# Altium footprint library Vowstar_Basic_Device.PcbLib: 170 footprints (part 1 of 11)
Each footprint in its own frame and in the unit in brackets; x right, y up, seen from the top. Pads: shape width x height; smd on the part's side, far side on the other; paste and mask are expansions set on the pad; w line width, h text height; cw(c..) or ccw(c..) is an arc to the next point about the centre after c.
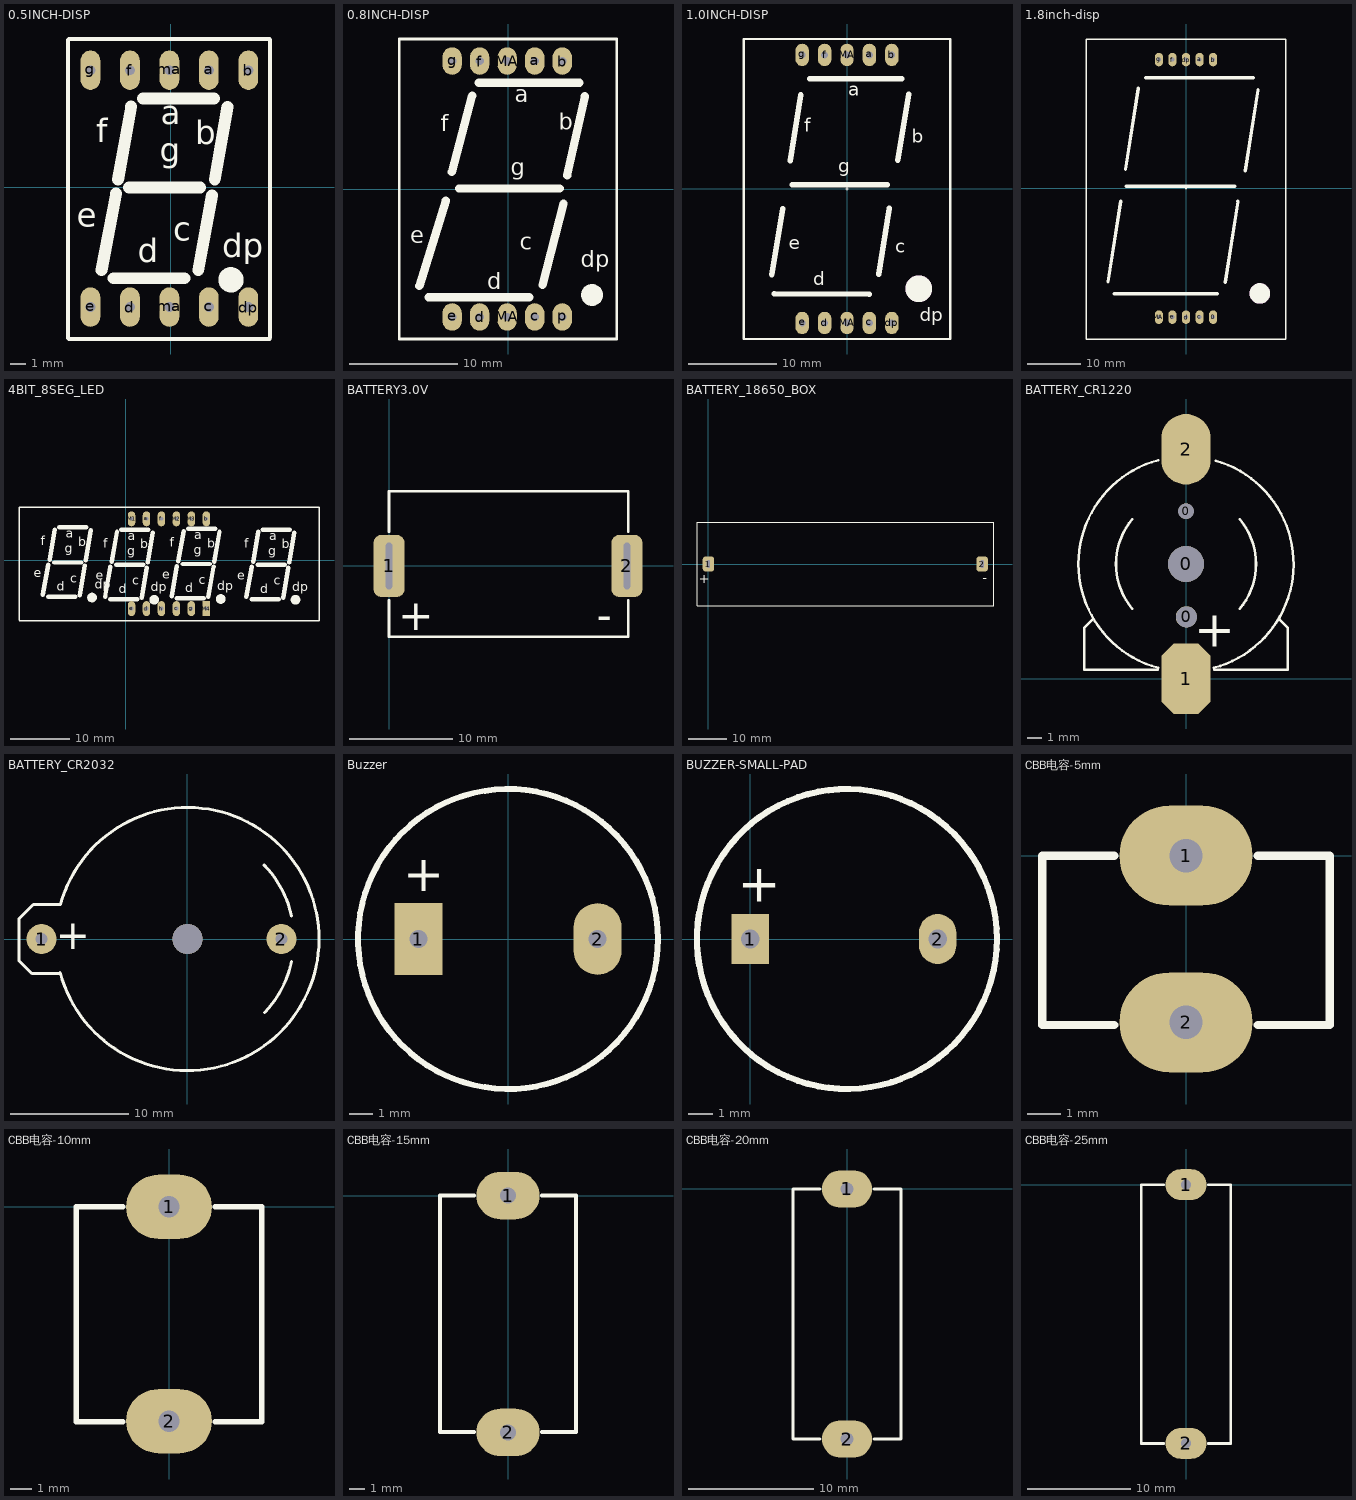
[diagram p0: the footprints below, top view; thin cyan lines are the x and y axes]

## 0.5INCH-DISP [mil]
pads (10):
  oval 50x100 hole 25: a(97,297) b(197,297) c(97,-303) d(-103,-303) dp(197,-303) e(-203,-303) f(-103,297) g(-203,297) ma(-3,-303) ma(-3,297)
Top Overlay:
  circle w40: c153,-234 r12
  lines w10: -260,-382 -260,374 ; -258,-384 251,-384 ; -258,376 251,376 ; 252,-380 252,374
  lines w30: -175,-210 -138,-15 ; -145,-230 35,-230 ; -133,20 -100,205 ; -105,0 75,0 ; -70,225 110,225 ; 70,-210 105,-20 ; 112,20 144.25,204.26
  text "c" at 7,-135 h60
  text "dp" at 131,-177 h60
  text "e" at -238,-100 h60
  text "d" at -83,-190 h60
  text "a" at -25,160 h60
  text "g" at -28,65 h60
  text "b" at 62,110 h60
  text "f" at -188,115 h60

## 0.8INCH-DISP [mil]
pads (10):
  oval 70x100 hole 30: a(97,465) b(197,465) c(97,-465) d(-103,-465) e(-203,-465) f(-103,465) g(-203,465) MA(-3,-465) MA(-3,465) p(197,-465)
Top Overlay:
  circle w40: c305.31,-385 r19.68
  lines w10: -395,-545 -395,545 395,545 395,-545 -395,-545
  lines w30: -322,-352 -226,-42 ; -289,-393 77.14,-393 ; -204,62 -130,339 ; -177.68,2.24 188.47,2.24 ; -108,-478 -103,-473 ; -106.14,386 260,386 ; 125,-349 202,-53 ; 215,49 279,337
  text "a" at 25,315 h60
  text "g" at 10,50 h60
  text "c" at 43,-220 h60
  text "d" at -75,-365 h60
  text "e" at -355,-198 h60
  text "f" at -245,210 h60
  text "dp" at 265,-285 h60
  text "b" at 185,215 h60

## 1.0INCH-DISP [mil]
pads (10):
  oval 60x100 hole 30: a(100,598) b(200,598) c(100,-598) d(-100,-598) dp(200,-598) e(-200,-598) f(-100,598) g(-200,598) MA(0,-598) MA(0,598)
Top Overlay:
  lines w2: -6,0 6,0 ; 0,-6 0,5
  lines w10: -461,-10 -461,10 ; -460.88,-669.58 -460.88,669 ; -459.88,-669.58 461,-669.58 461,669 -459.88,669
  lines w25: -335,-382 -287,-89 ; -324,-467 99,-470 ; -254,126 -206,419 ; -244,19 179,19 ; -167,492 245,492 ; 141,-380 189,-87 ; 227,129 275,422
  text "a" at 5,415 h60
  text "b" at 290,205 h60
  text "c" at 215,-285 h60
  text "d" at -150,-430 h60
  text "e" at -260,-270 h60
  text "f" at -190,255 h60
  text "dp" at 325,-590 h60
  text "g" at -40,75 h60
Top Overlay keep-out:
  circle w100: c320.57,-445 r9.43

## 1.8inch-disp [mil]
pads (10):
  oval 60x100 hole 30: 0(200,-950) a(100,950) b(200,950) c(100,-950) d(0,-950) dp(0,950) e(-100,-950) f(-100,950) g(-200,950) MA(-200,-950)
Top Overlay:
  lines w2: -5,0 5,0 ; 0,-5 0,4
  lines w10: -736,-1111 -736,1101.6 736,1101.6 736,-1111 -736,-1111
  lines w25: -575,-691 -481,-93 ; -528,-778 230,-778 ; -446,139 -352,737 ; -442,15 359,15 ; -299,815 496,815 ; 289,-694 383,-96 ; 437,128 531,726
Top Overlay keep-out:
  circle w100: c544.39,-775 r25.61

## 4BIT_8SEG_LED [mil]
pads (12):
  oval 50x100 hole 25: a(137,277) b(537,277) c(337,-323) d(137,-323) e(37,-323) f(237,277) g(437,-323) h(237,-323) M1(37,277) M2(337,277) M3(437,277)
  rect 50x100 hole 25: M4(537,-323)
Top Overlay:
  circle w40: c188,-264 r12
  circle w40: c-227,-249 r12
  circle w40: c633,-259 r12
  circle w40: c1133,-264 r12
  lines w10: -715,-405 1290,-405 ; -715,-401 -715,355 1290,355 1290,-404
  lines w30: -555,-230 -520,-30 ; -520,-245 -340,-245 ; -510,5 -475,205 ; -480,-15 -300,-15 ; -445,220 -265,220 ; -310,-235 -275,-35 ; -270,0 -235,200 ; -140,-245 -105,-45 ; -105,-260 75,-260 ; -95,-10 -60,190 ; -65,-30 115,-30 ; -30,205 150,205 ; 105,-250 140,-50 ; 145,-15 180,185 ; 305,-240 340,-40 ; 340,-255 520,-255 ; 350,-5 385,195 ; 380,-25 560,-25 ; 415,210 595,210 ; 550,-245 585,-45 ; 590,-10 625,190 ; 805,-245 840,-45 ; 840,-260 1020,-260 ; 850,-10 885,190 ; 880,-30 1060,-30 ; 915,205 1095,205 ; 1050,-250 1085,-50 ; 1090,-15 1125,185
  text "c" at 42,-165 h60
  text "dp" at 166,-207 h60
  text "e" at -203,-130 h60
  text "d" at -48,-220 h60
  text "a" at 12,135 h60
  text "g" at 7,35 h60
  text "b" at 97,80 h60
  text "f" at -153,85 h60
  text "c" at -373,-150 h60
  text "dp" at -209,-192 h60
  text "e" at -618,-115 h60
  text "d" at -463,-205 h60
  text "a" at -403,150 h60
  text "g" at -408,50 h60
  text "b" at -318,95 h60
  text "f" at -568,100 h60
  text "c" at 487,-160 h60
  text "dp" at 611,-202 h60
  text "e" at 242,-125 h60
  text "d" at 397,-215 h60
  text "a" at 457,140 h60
  text "g" at 452,40 h60
  text "b" at 542,85 h60
  text "f" at 292,90 h60
  text "c" at 987,-165 h60
  text "dp" at 1111,-207 h60
  text "e" at 742,-130 h60
  text "d" at 897,-220 h60
  text "a" at 957,135 h60
  text "g" at 952,35 h60
  text "b" at 1042,80 h60
  text "f" at 792,85 h60

## BATTERY3.0V [mm]
pads (2):
  rrect50% 3x6 hole 0.6 slot 4.5 at 90 deg: 1(0,0) 2(23,0)
Top Overlay:
  lines w0.254: 0,-3.302 0,-6.858 23.114,-6.858 23.114,-3.302 ; 0,3.302 0,7.239 23.114,7.239 23.114,3.302
  text "-" at 20.066,-6.223 h3
  text "+" at 0.889,-6.223 h3

## BATTERY_18650_BOX [mm] "BATTERY_18650_BOX"
height 21
pads (2):
  rrect50% 3x4 hole 0.8 slot 2 at 90 deg: 1(0,0) 2(72,0)
Top Overlay:
  lines w0.254: -3,-11 -3,11 75,11 75,-11 -3,-11
  text "+" at 0.345,-2.921 h2.54
  text "-" at 73.348,-2.921 h2.54

## BATTERY_CR1220 [mm] "CR1220"
pads (5):
  round 2.54 hole 2.54: 0(0,8.128)
  round 1.1 hole 1.1: 0(0,11.878)
  round 1.5 hole 1.5: 0(0.025,4.378)
  oct 3.5x5 smd: 1(0,0)
  oval 3.5x5 smd: 2(0,16.256)
Top Overlay:
  lines w0.178: -6.6,4.228 -7.2,3.628 -7.2,0.628 -2,0.628 ; -3.815,4.959 cw(c0,8.128) -3.812,11.3 ; -1.963,0.765 cw(c0,8.128) -7.62,8.128 cw(c0,8.128) -1.963,15.491 ; 1.963,0.765 ccw(c0,8.128) 2.093,15.455 ; 2,0.628 7.2,0.628 7.2,3.628 6.625,4.203 ; 3.81,4.953 ccw(c0,8.128) 3.812,11.3
  text "+" at 3.49,4.445 h2.54
3D body "User Library-BATTERY HOLDER CR1220.STEP": height 3.94, standoff -1, extent -7.504,-1.355 7.493,17.145

## BATTERY_CR2032 [mil] "CR2032"
pads (2):
  round 100 hole 40: 1(-485.1,0) 2(312.4,0)
via 0,0 diameter 100 hole 100
Top Overlay:
  lines w10: -422.97,-111.42 ccw(c0,0) -421.7,116.13 ; -422.6,-115 -517.6,-115 -560.1,-72.5 -560.1,67.5 -512.6,115 -422.6,115 ; 254.25,246.79 cw(c0,0) 346.12,75.82 ; 256.78,-244.16 ccw(c0,0) 346.35,-74.77
  text "+" at -322.6,50 h100
3D body "User Library-BATTERY HOLDER CR2032.step": height 272, standoff -157.48, extent -589.29,-452.75 532.75,452.75

## Buzzer [mil] "Buzzer"
pads (2):
  rect 80x120 hole 30: 1(-150,0)
  oval 80x120 hole 30: 2(150,0)
Top Overlay:
  circle w10: c0,0 r251.05
  text "+" at -175,80 h60
3D body "User Library-Buzzer-WST-1203UX.step": height 379.92, standoff -177.17, extent -236.21,-236.22 372.21,236.23

## BUZZER-SMALL-PAD [mil]
pads (2):
  rect 60x80 hole 30: 1(0,0)
  oval 60x80 hole 30: 2(300,0)
Top Overlay:
  circle w10: c155,0 r240
  text "+" at -20,60 h60
3D body "User Library-Buzzer-WST-1203UX.step": height 379.92, standoff -177.17, extent -86.21,-236.22 522.21,236.23

## CBB电容-5mm [mm] "CBB电容"
height 15
pads (2):
  oval 4x3 hole 1: 1(0,0) 2(0,-5)
Top Overlay:
  lines w0.254: -2.159,-5.08 -4.318,-5.08 -4.318,0 -2.159,0 ; 2.159,-5.08 4.318,-5.08 4.318,0 2.159,0
3D body: height 12.7, standoff 0, extent -4.318,-5.08 4.318,0
3D body: height 1, standoff -3, extent -0.381,-5.397 0.381,-4.762
3D body: height 1, standoff -3, extent -0.381,-0.254 0.381,0.381

## CBB电容-10mm [mm] "CBB电容"
height 15
pads (2):
  oval 4x3 hole 1: 1(0,0) 2(0,-10)
Top Overlay:
  lines w0.254: -2.159,-10.033 -4.318,-10.033 -4.318,0 -2.159,0 ; 2.159,-10.033 4.318,-10.033 4.318,0 2.159,0
3D body: height 1, standoff -3, extent -0.381,-0.254 0.381,0.381
3D body: height 1, standoff -3, extent -0.381,-10.35 0.381,-9.715
3D body: height 12.7, standoff 0, extent -4.318,-10.033 4.318,0

## CBB电容-15mm [mm] "CBB电容"
height 15
pads (2):
  oval 4x3 hole 1: 1(0,0) 2(0,-15)
Top Overlay:
  lines w0.254: -2.159,-14.986 -4.318,-14.986 -4.318,0 -2.159,0 ; 2.159,-14.986 4.318,-14.986 4.318,0 2.159,0
3D body: height 12.7, standoff 0, extent -4.318,-14.986 4.318,0
3D body: height 1, standoff -3, extent -0.381,-15.303 0.381,-14.668
3D body: height 1, standoff -3, extent -0.381,-0.254 0.381,0.381

## CBB电容-20mm [mm] "CBB电容"
height 15
pads (2):
  oval 4x3 hole 1: 1(0,0) 2(0,-20)
Top Overlay:
  lines w0.254: -4.318,-20 -2.159,-20 ; -4.318,-19.939 -4.318,0 -2.159,0 ; 2.159,-20 4.318,-20 4.318,0 2.159,0
3D body: height 12.7, standoff 0, extent -4.318,-20.066 4.318,0
3D body: height 1, standoff -3, extent -0.381,-20.383 0.381,-19.748
3D body: height 1, standoff -3, extent -0.381,-0.254 0.381,0.381

## CBB电容-25mm [mm] "CBB电容"
height 15
pads (2):
  oval 4x3 hole 1: 1(0,0) 2(0,-25)
Top Overlay:
  lines w0.254: -2.159,-25.019 -4.318,-25.019 -4.318,0 -2.159,0 ; 2.159,-25.019 4.318,-25.019 4.318,0 2.159,0
3D body: height 1, standoff -3, extent -0.381,-0.254 0.381,0.381
3D body: height 1, standoff -3, extent -0.381,-25.336 0.381,-24.701
3D body: height 12.7, standoff 0, extent -4.318,-25.019 4.318,0